# Altium footprint library PcbLib1.PcbLib: 1009 footprints (part 31 of 64)
Each footprint in its own frame and in the unit in brackets; x right, y up, seen from the top. Pads: shape width x height; smd on the part's side, far side on the other; paste and mask are expansions set on the pad; w line width, h text height; cw(c..) or ccw(c..) is an arc to the next point about the centre after c.
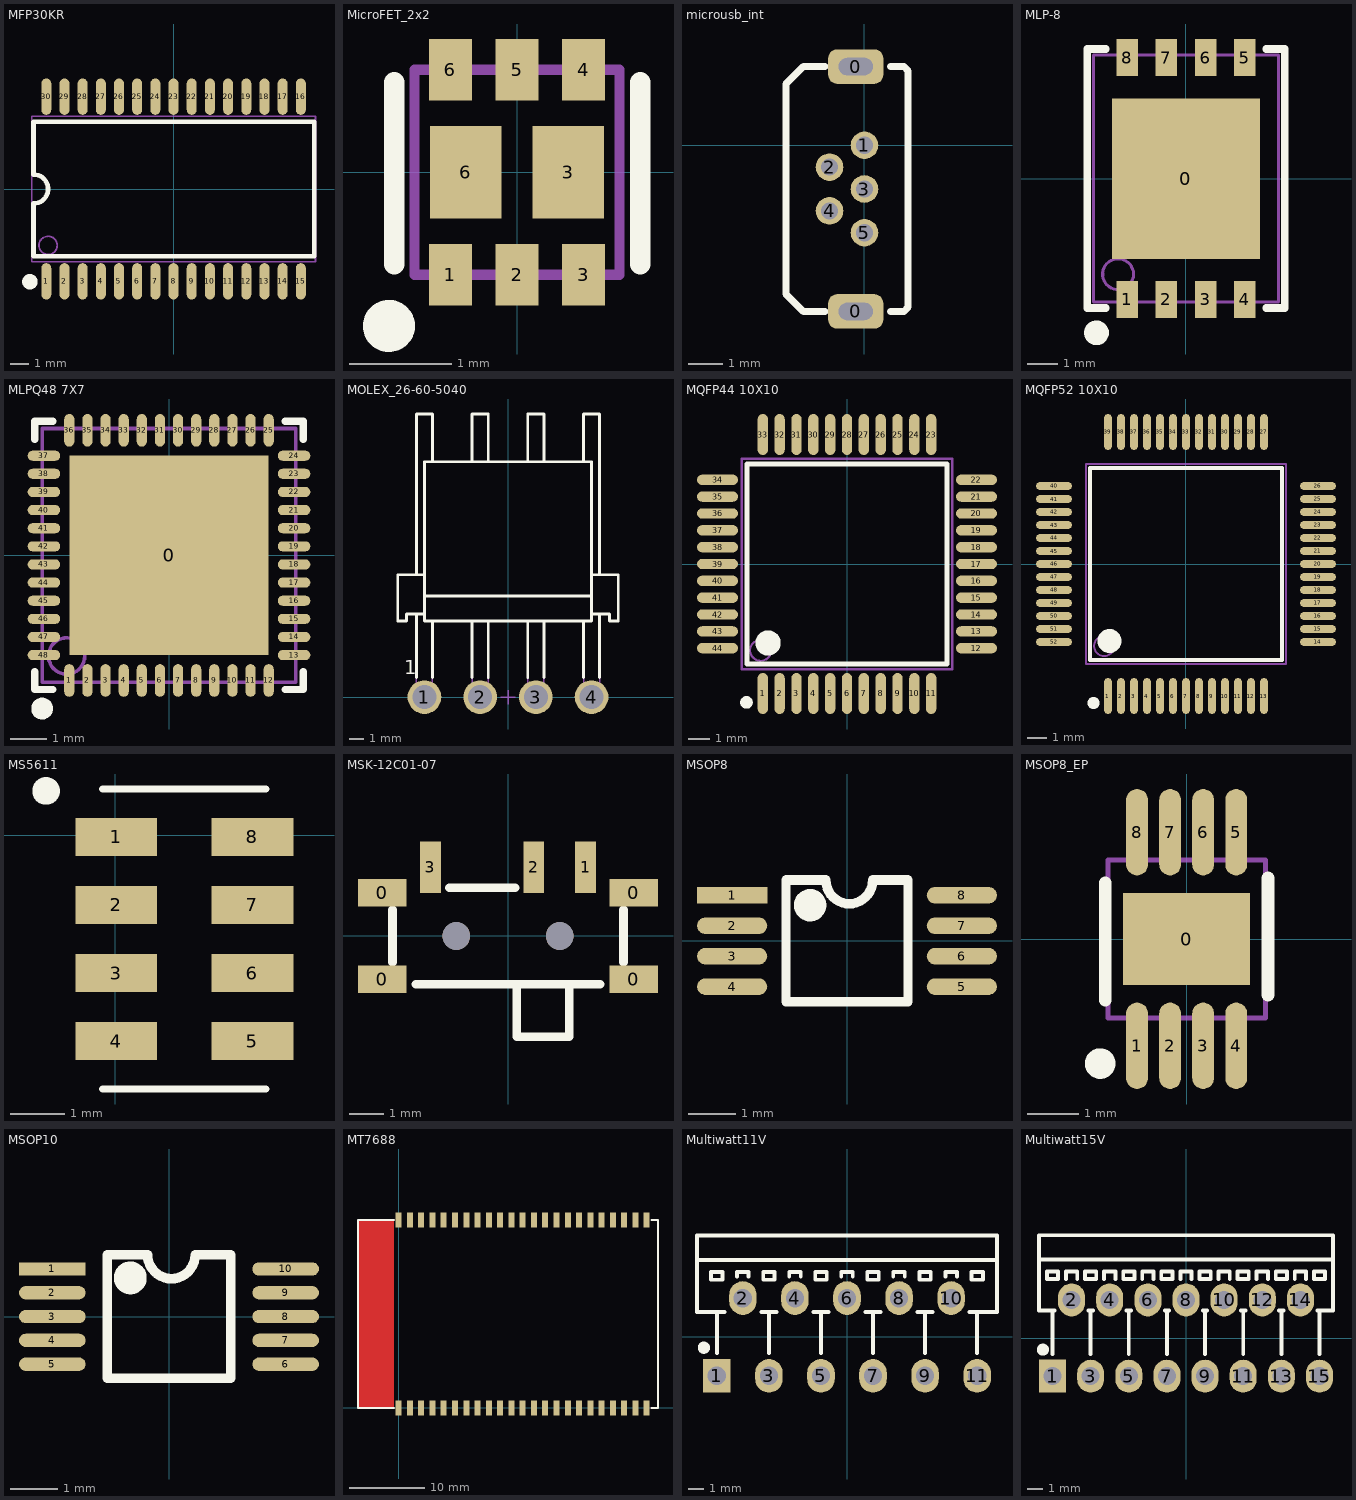
[diagram p30: the footprints below, top view; thin cyan lines are the x and y axes]

## MFP30KR [mm] "THB6128"
pads (30):
  oval 0.55x2 smd: 1(-7,-5.08) 2(-6,-5.08) 3(-5,-5.08) 4(-4,-5.08) 5(-3,-5.08) 6(-2,-5.08) 7(-1,-5.08) 8(0,-5.08) 9(1,-5.08) 10(2,-5.08) 11(3,-5.08) 12(4,-5.08) 13(5,-5.08) 14(6,-5.08) 15(7,-5.08) 16(7,5.08) 17(6,5.08) 18(5,5.08) 19(4,5.08) 20(3,5.08) 21(2,5.08) 22(1,5.08) 23(0,5.08) 24(-1,5.08) 25(-2,5.08) 26(-3,5.08) 27(-4,5.08) 28(-5,5.08) 29(-6,5.08) 30(-7,5.08)
Top Overlay:
  circle w0.45: c-7.9,-5.1 r0.2
  lines w0.254: -7.7,-3.7 -7.7,-0.8 ccw(c-7.7,0) -7.7,0.8 -7.7,3.7 7.732,3.7 7.732,-3.7 -7.7,-3.7
Mechanical 13:
  circle w0.1: c-6.9,-3.1 r0.5
  lines w0.1: -7.8,-4 7.8,-4 7.8,4 -7.8,4 -7.8,-4

## MicroFET_2x2 [mm]
pads (8):
  rect 0.42x0.6 smd mask+0.051: 1(-0.65,-1) 2(0,-1) 3(0.65,-1) 4(0.65,1) 5(0,1) 6(-0.65,1)
  rect 0.7x0.9 smd mask+0.051: 3(0.5,0) 6(-0.5,0)
Top Overlay:
  circle w0.254: c-1.25,-1.5 r0.127
  lines w0.2: -1.2,-0.9 -1.2,0.878 ; 1.2,-0.9 1.2,0.878
Mechanical 13:
  lines w0.1: -1,-1 1,-1 1,1 -1,1 -1,-1

## microusb_int [mm]
pads (7):
  rrect50% 1.6x1 hole 0.5 slot 1 at 0.35 deg mask+0.051: 0(-0.254,-4.826) 0(-0.254,2.286)
  round 0.8 hole 0.5 mask+0.051: 1(0,0) 2(-1.016,-0.635) 3(0,-1.27) 4(-1.016,-1.905) 5(0,-2.54)
Top Overlay:
  lines w0.203: -1.143,-4.826 -1.778,-4.826 -2.286,-4.318 -2.286,1.778 -1.778,2.286 -1.143,2.286 ; 0.762,-4.826 1.143,-4.826 1.27,-4.699 1.27,2.159 1.143,2.286 0.762,2.286

## MLP-8 [mm]
pads (9):
  rect 4.8x5.2 smd: 0(0,0)
  rect 0.7x1.2 smd: 1(-1.905,-3.92) 2(-0.635,-3.92) 3(0.635,-3.92) 4(1.905,-3.92) 5(1.905,3.92) 6(0.635,3.92) 7(-0.635,3.92) 8(-1.905,3.92)
Top Overlay:
  circle w0.4: c-2.9,-5 r0.2
  lines w0.254: -2.6,-4.2 -3.2,-4.2 -3.2,4.2 -2.6,4.2 ; 2.6,-4.2 3.2,-4.2 3.2,4.2 2.6,4.2
Mechanical 13:
  circle w0.1: c-2.2,-3.1 r0.5
  lines w0.1: -3,-4 3,-4 3,4 -3,4 -3,-4

## MLPQ48 7X7 [mm]
pads (49):
  rect 5.5x5.5 smd mask+0.051: 0(0,0)
  oval 0.28x0.9 smd mask+0.051: 1(-2.75,-3.45) 2(-2.25,-3.45) 3(-1.75,-3.45) 4(-1.25,-3.45) 5(-0.75,-3.45) 6(-0.25,-3.45) 7(0.25,-3.45) 8(0.75,-3.45) 9(1.25,-3.45) 10(1.75,-3.45) 11(2.25,-3.45) 12(2.75,-3.45) 25(2.75,3.45) 26(2.25,3.45) 27(1.75,3.45) 28(1.25,3.45) 29(0.75,3.45) 30(0.25,3.45) 31(-0.25,3.45) 32(-0.75,3.45) 33(-1.25,3.45) 34(-1.75,3.45) 35(-2.25,3.45) 36(-2.75,3.45)
  oval 0.9x0.28 smd mask+0.051: 13(3.45,-2.75) 14(3.45,-2.25) 15(3.45,-1.75) 16(3.45,-1.25) 17(3.45,-0.75) 18(3.45,-0.25) 19(3.45,0.25) 20(3.45,0.75) 21(3.45,1.25) 22(3.45,1.75) 23(3.45,2.25) 24(3.45,2.75) 37(-3.45,2.75) 38(-3.45,2.25) 39(-3.45,1.75) 40(-3.45,1.25) 41(-3.45,0.75) 42(-3.45,0.25) 43(-3.45,-0.25) 44(-3.45,-0.75) 45(-3.45,-1.25) 46(-3.45,-1.75) 47(-3.45,-2.25) 48(-3.45,-2.75)
Top Overlay:
  circle w0.3: c-3.5,-4.225 r0.15
  lines w0.2: -3.7,-3.2 -3.7,-3.7 -3.2,-3.7 ; -3.7,3.2 -3.7,3.7 -3.2,3.7 ; 3.2,-3.7 3.7,-3.7 3.7,-3.2 ; 3.2,3.7 3.7,3.7 3.7,3.2
Mechanical 13:
  circle w0.1: c-2.825,-2.775 r0.5
  lines w0.1: -3.5,-3.5 -3.5,3.5 3.5,3.5 3.5,-3.5 -3.5,-3.5

## MOLEX_26-60-5040 [mm] "3.96mm (.156\") Pitch KK?Solid Header,Right Angle, 4 Circuits, Tin (Sn) Plating"
height 9
pads (4):
  round 2.4 hole 1.7: 1(-5.944,0) 2(-1.981,0) 3(1.981,0) 4(5.944,0)
Top Overlay:
  lines w0.2: -6.515,1.387 -6.515,5.918 ; -6.515,8.712 -6.515,20.142 -5.372,20.142 -5.372,16.739 ; -5.944,5.918 -7.214,5.918 -7.214,5.41 -7.849,5.41 -7.849,8.712 -5.944,8.712 ; -5.944,7.188 5.944,7.188 ; -5.372,1.387 -5.372,5.41 ; -2.553,1.387 -2.553,5.41 ; -2.553,16.739 -2.553,20.142 -1.41,20.142 -1.41,16.739 ; -1.41,1.387 -1.41,5.41 ; 1.41,1.387 1.41,5.41 ; 1.41,16.739 1.41,20.142 2.553,20.142 2.553,16.739 ; 2.553,1.387 2.553,5.41 ; 5.372,1.387 5.372,5.41 ; 5.372,16.739 5.372,20.142 6.515,20.142 6.515,8.712 ; 5.944,5.918 7.214,5.918 7.214,5.41 7.849,5.41 7.849,8.712 5.944,8.712 ; 6.515,1.387 6.515,5.918 ; -5.944,5.41 -5.944,16.739 5.944,16.739 5.944,5.41 -5.944,5.41
  text "1" at -7.388,1.62 h1
Mechanical 8:
  lines w0.1: -6.444,0 -5.944,0 ; -5.944,-0.5 -5.944,0 ; -5.944,0.5 -5.944,0 ; -5.444,0 -5.944,0 ; -2.481,0 -1.981,0 ; -1.981,-0.5 -1.981,0 ; -1.981,0.5 -1.981,0 ; -1.481,0 -1.981,0 ; -0.5,0 0,0 ; 0,-0.5 0,0 ; 0,0.5 0,0 ; 0.5,0 0,0 ; 1.481,0 1.981,0 ; 1.981,-0.5 1.981,0 ; 1.981,0.5 1.981,0 ; 2.481,0 1.981,0 ; 5.444,0 5.944,0 ; 5.944,-0.5 5.944,0 ; 5.944,0.5 5.944,0 ; 6.444,0 5.944,0
Mechanical 14:
  lines w0.1: -6.515,5.918 -6.515,-0.572 ; -6.515,8.712 -6.515,20.142 -5.372,20.142 -5.372,16.739 ; -5.944,5.918 -7.214,5.918 -7.214,5.41 -7.849,5.41 -7.849,8.712 -5.944,8.712 ; -5.944,7.188 5.944,7.188 ; -5.372,5.41 -5.372,-0.572 ; -2.553,5.41 -2.553,-0.572 -1.41,-0.572 -1.41,5.41 ; -2.553,16.739 -2.553,20.142 -1.41,20.142 -1.41,16.739 ; 1.41,5.41 1.41,-0.572 2.553,-0.572 2.553,5.41 ; 1.41,16.739 1.41,20.142 2.553,20.142 2.553,16.739 ; 5.372,5.41 5.372,-0.572 6.515,-0.572 6.515,5.918 ; 5.372,16.739 5.372,20.142 6.515,20.142 6.515,8.712 ; 5.944,5.918 7.214,5.918 7.214,5.41 7.849,5.41 7.849,8.712 5.944,8.712 ; -6.515,-0.572 -5.372,-0.572 ; -6.515,-0.572 -5.372,-0.572 ; -5.944,5.41 -5.944,16.739 5.944,16.739 5.944,5.41 -5.944,5.41
  text "1" at -7.388,1.62 h1
3D body "v240-170.stp": height 0.02, standoff -1.65, extent 4.744,-1.2 7.144,1.2
3D body "v240-170.stp": height 0.02, standoff -1.65, extent 0.781,-1.2 3.181,1.2
3D body "v240-170.stp": height 0.02, standoff -1.65, extent -3.181,-1.2 -0.781,1.2
3D body "v240-170.stp": height 0.02, standoff -1.65, extent -7.144,-1.2 -4.744,1.2
3D body "MOLEX_26-60-5040.stp": height 10.01, standoff -3.96, extent -7.849,-0.571 7.849,20.142

## MQFP44 10X10 [mm]
pads (44):
  oval 0.49x1.95 smd: 1(-4,-6.15) 2(-3.2,-6.15) 3(-2.4,-6.15) 4(-1.6,-6.15) 5(-0.8,-6.15) 6(0,-6.15) 7(0.8,-6.15) 8(1.6,-6.15) 9(2.4,-6.15) 10(3.2,-6.15) 11(4,-6.15) 23(4,6.15) 24(3.2,6.15) 25(2.4,6.15) 26(1.6,6.15) 27(0.8,6.15) 28(0,6.15) 29(-0.8,6.15) 30(-1.6,6.15) 31(-2.4,6.15) 32(-3.2,6.15) 33(-4,6.15)
  oval 1.95x0.49 smd: 12(6.15,-4) 13(6.15,-3.2) 14(6.15,-2.4) 15(6.15,-1.6) 16(6.15,-0.8) 17(6.15,0) 18(6.15,0.8) 19(6.15,1.6) 20(6.15,2.4) 21(6.15,3.2) 22(6.15,4) 34(-6.15,4) 35(-6.15,3.2) 36(-6.15,2.4) 37(-6.15,1.6) 38(-6.15,0.8) 39(-6.15,0) 40(-6.15,-0.8) 41(-6.15,-1.6) 42(-6.15,-2.4) 43(-6.15,-3.2) 44(-6.15,-4)
Top Overlay:
  circle w0.6: c-3.75,-3.75 r0.3
  circle w0.3: c-4.775,-6.575 r0.15
  lines w0.254: -4.75,-4.75 -4.75,4.75 4.75,4.75 4.75,-4.75 -4.75,-4.75
Mechanical 13:
  circle w0.1: c-4.1,-4.1 r0.5
  lines w0.1: -5,-5 -5,5 5,5 5,-5 -5,-5

## MQFP52 10X10 [mm]
pads (52):
  oval 0.38x1.8 smd mask+0.051: 1(-3.9,-6.6) 2(-3.25,-6.6) 3(-2.6,-6.6) 4(-1.95,-6.6) 5(-1.3,-6.6) 6(-0.65,-6.6) 7(0,-6.6) 8(0.65,-6.6) 9(1.3,-6.6) 10(1.95,-6.6) 11(2.6,-6.6) 12(3.25,-6.6) 13(3.9,-6.6) 27(3.9,6.6) 28(3.25,6.6) 29(2.6,6.6) 30(1.95,6.6) 31(1.3,6.6) 32(0.65,6.6) 33(0,6.6) 34(-0.65,6.6) 35(-1.3,6.6) 36(-1.95,6.6) 37(-2.6,6.6) 38(-3.25,6.6) 39(-3.9,6.6)
  oval 1.8x0.38 smd mask+0.051: 14(6.6,-3.9) 15(6.6,-3.25) 16(6.6,-2.6) 17(6.6,-1.95) 18(6.6,-1.3) 19(6.6,-0.65) 20(6.6,0) 21(6.6,0.65) 22(6.6,1.3) 23(6.6,1.95) 24(6.6,2.6) 25(6.6,3.25) 26(6.6,3.9) 40(-6.6,3.9) 41(-6.6,3.25) 42(-6.6,2.6) 43(-6.6,1.95) 44(-6.6,1.3) 45(-6.6,0.65) 46(-6.6,0) 47(-6.6,-0.65) 48(-6.6,-1.3) 49(-6.6,-1.95) 50(-6.6,-2.6) 51(-6.6,-3.25) 52(-6.6,-3.9)
Top Overlay:
  circle w0.6: c-3.825,-3.85 r0.3
  circle w0.3: c-4.625,-6.95 r0.15
  lines w0.2: -4.8,-4.8 4.8,-4.8 4.8,4.8 -4.8,4.8 -4.8,-4.8
Mechanical 13:
  circle w0.1: c-4.1,-4.1 r0.5
  lines w0.1: -5,-5 5,-5 5,5 -5,5 -5,-5

## MS5611 [mm]
pads (8):
  rect 1.5x0.7 smd: 1(0.02,-0.03) 2(0.02,-1.28) 3(0.02,-2.53) 4(0.02,-3.78) 5(2.52,-3.78) 6(2.52,-2.53) 7(2.52,-1.28) 8(2.52,-0.03)
Top Overlay:
  circle w0.454: c-1.27,0.813 r0.025
  lines w0.127: -0.23,-4.659 2.77,-4.659 ; -0.23,0.849 2.77,0.849
3D body "SM5611-.STEP": height 1, standoff -0.01, extent -0.23,-4.492 2.77,0.508

## MSK-12C01-07 [mm]
pads (9):
  rect 1.4x0.8 smd: 0(-3.65,-1.25) 0(-3.65,1.25) 0(3.65,-1.25) 0(3.65,1.25)
  rect 0.6x1.5 smd: 1(2.25,1.996) 2(0.75,1.996) 3(-2.25,1.996)
  round 0.8 hole 0.8: " "(-1.5,0) " "(1.5,0)
Top Overlay:
  lines w0.254: -3.35,-0.762 -3.35,0.762 ; -2.667,-1.397 2.667,-1.397 ; -1.699,1.397 0.206,1.397 ; 0.254,-1.4 0.254,-2.921 1.778,-2.921 1.778,-1.4 ; 3.35,-0.762 3.35,0.762
3D body "MSK-12C01-07.STEP": height 1.5, standoff -0.5, extent -3.92,-2.887 3.92,2.413

## MSOP8 [mm]
pads (8):
  rect 1.5x0.35 smd: 1(-2.45,0.975)
  oval 1.5x0.35 smd: 2(-2.45,0.325) 3(-2.45,-0.325) 4(-2.45,-0.975) 5(2.45,-0.975) 6(2.45,-0.325) 7(2.45,0.325) 8(2.45,0.975)
Top Overlay:
  circle w0.381: c-0.787,0.762 r0.155
  lines w0.2: -1.3,1.3 -1.3,-1.3 1.3,-1.3 1.3,1.3
  lines w0.203: -1.3,1.3 -0.46,1.3 ; -0.45,1.3 ccw(c0.058,1.3) 0.058,0.792 ; 0.042,0.792 ccw(c0.042,1.3) 0.55,1.3 ; 0.556,1.3 1.3,1.3
3D body "MSOP8.STEP": height 0.95, standoff 0, extent -2.45,-1.499 2.45,1.501

## MSOP8_EP [mm] "MSOP-8, with EP"
pads (9):
  rect 2.5x1.8 smd mask+0.051: 0(0,0)
  oval 0.43x1.7 smd mask+0.051: 1(-0.975,-2.1) 2(-0.325,-2.1) 3(0.325,-2.1) 4(0.975,-2.1) 5(0.975,2.1) 6(0.325,2.1) 7(-0.325,2.1) 8(-0.975,2.1)
Top Overlay:
  circle w0.3: c-1.7,-2.45 r0.15
  lines w0.254: -1.6,-1.2 -1.6,1.1 ; 1.6,-1.1 1.6,1.2
Mechanical 13:
  lines w0.1: -1.55,-1.55 1.55,-1.55 1.55,1.55 -1.55,1.55 -1.55,-1.55
3D body "SW3dPS-MSOP8.STEP": height 1.05, standoff -0.05, extent -1.551,-2.469 1.549,2.469

## MSOP10 [mm]
pads (10):
  rect 1.4x0.28 smd: 1(-2.45,1)
  oval 1.4x0.28 smd: 2(-2.45,0.5) 3(-2.45,0) 4(-2.45,-0.5) 5(-2.45,-1) 6(2.45,-1) 7(2.45,-0.5) 8(2.45,0) 9(2.45,0.5) 10(2.45,1)
Top Overlay:
  circle w0.381: c-0.813,0.813 r0.155
  lines w0.2: -1.3,1.3 -1.3,-1.3 1.3,-1.3 1.3,1.3
  lines w0.203: -1.3,1.3 -0.46,1.3 ; -0.45,1.3 ccw(c0.058,1.3) 0.058,0.792 ; 0.042,0.792 ccw(c0.042,1.3) 0.55,1.3 ; 0.556,1.3 1.3,1.3
3D body "MSOP10.STEP": height 0.95, standoff 0, extent -2.425,-1.524 2.475,1.476

## MT7688 [mm] "WiFi模块"
pads (46):
  rect 0.8x2 smd: 1(0,0) 2(1.5,0) 3(3,0) 4(4.5,0) 5(6,0) 6(7.5,0) 7(9,0) 8(10.5,0) 9(12,0) 10(13.5,0) 11(15,0) 12(16.5,0) 13(18,0) 14(19.5,0) 15(21,0) 16(22.5,0) 17(24,0) 18(25.5,0) 19(27,0) 20(28.5,0) 21(30,0) 22(31.5,0) 23(33,0) 24(33,25) 25(31.5,25) 26(30,25) 27(28.5,25) 28(27,25) 29(25.5,25) 30(24,25) 31(22.5,25) 32(21,25) 33(19.5,25) 34(18,25) 35(16.5,25) 36(15,25) 37(13.5,25) 38(12,25) 39(10.5,25) 40(9,25) 41(7.5,25) 42(6,25) 43(4.5,25) 44(3,25) 45(1.5,25) 46(0,25)
Top Layer:
  pour cut-out: -5.4,25.019 -0.635,25.019 -0.635,0 -5.4,0
Bottom Layer:
  pour cut-out: -5.4,25.019 -0.635,25.019 -0.635,0 -5.4,0
Top Overlay:
  lines w0.254: -0.635,0 -5.4,0 -5.4,25.019 -0.635,25.019 ; 33.63,25.019 34.5,25.019 34.5,0 33.655,0

## Multiwatt11V [mm]
pads (11):
  rect 1.8x2.2 hole 1.2: 1(-8.5,-2.54)
  oval 1.8x2.2 hole 1.2: 2(-6.8,2.54) 3(-5.1,-2.54) 4(-3.4,2.54) 5(-1.7,-2.54) 6(0,2.54) 7(1.7,-2.54) 8(3.4,2.54) 9(5.1,-2.54) 10(6.8,2.54) 11(8.5,-2.54)
Top Overlay:
  circle w0.4: c-9.35,-0.7 r0.2
  lines w0.254: -8.5,-1.06 -8.5,1.64 ; -8,1.64 -9.8,1.64 -9.8,5.04 ; -7.175,3.94 -7.175,4.24 -6.425,4.24 -6.425,3.94 ; -5.6,1.64 -4.6,1.64 ; -5.1,-1.06 -5.1,1.64 ; -3.775,3.94 -3.775,4.24 -3.025,4.24 -3.025,3.94 ; -2.2,1.64 -1.2,1.64 ; -1.7,-1.06 -1.7,1.64 ; -0.375,3.94 -0.375,4.24 0.375,4.24 0.375,3.94 ; 1.2,1.64 2.2,1.64 ; 1.7,-1.06 1.7,1.64 ; 3.025,3.94 3.025,4.24 3.775,4.24 3.775,3.94 ; 4.6,1.64 5.6,1.64 ; 5.1,-1.06 5.1,1.64 ; 6.425,3.94 6.425,4.24 7.175,4.24 7.175,3.94 ; 8,1.64 9.8,1.64 9.8,5.04 ; 8.5,-1.06 8.5,1.64 ; -9.8,5.04 9.8,5.04 ; -9.8,5.04 -9.8,6.64 9.8,6.64 9.8,5.04 ; -8.875,3.74 -8.125,3.74 -8.125,4.24 -8.875,4.24 -8.875,3.74 ; -5.475,3.74 -5.475,4.24 -4.725,4.24 -4.725,3.74 -5.475,3.74 ; -2.075,3.74 -2.075,4.24 -1.325,4.24 -1.325,3.74 -2.075,3.74 ; 1.325,3.74 1.325,4.24 2.075,4.24 2.075,3.74 1.325,3.74 ; 4.725,3.74 4.725,4.24 5.475,4.24 5.475,3.74 4.725,3.74 ; 8.125,3.74 8.875,3.74 8.875,4.24 8.125,4.24 8.125,3.74

## Multiwatt15V [mm]
pads (15):
  rect 1.8x2.2 hole 1.2: 1(-8.89,-2.54)
  oval 1.8x2.2 hole 1.2: 2(-7.62,2.54) 3(-6.35,-2.54) 4(-5.08,2.54) 5(-3.81,-2.54) 6(-2.54,2.54) 7(-1.27,-2.54) 8(0,2.54) 9(1.27,-2.54) 10(2.54,2.54) 11(3.81,-2.54) 12(5.08,2.54) 13(6.35,-2.54) 14(7.62,2.54) 15(8.89,-2.54)
Top Overlay:
  circle w0.4: c-9.525,-0.775 r0.2
  lines w0.254: -8.89,-1.06 -8.89,1.84 ; -8.74,1.84 -9.8,1.84 -9.8,5.24 ; -7.995,3.94 -7.995,4.44 -7.245,4.44 -7.245,3.94 ; -6.5,1.84 -6.2,1.84 ; -6.35,-1.06 -6.35,1.84 ; -5.455,3.94 -5.455,4.44 -4.705,4.44 -4.705,3.94 ; -3.96,1.84 -3.66,1.84 ; -3.81,-1.06 -3.81,1.84 ; -2.915,3.94 -2.915,4.44 -2.165,4.44 -2.165,3.94 ; -1.42,1.84 -1.12,1.84 ; -1.27,-1.06 -1.27,1.84 ; -0.375,3.94 -0.375,4.44 0.375,4.44 0.375,3.94 ; 1.12,1.84 1.42,1.84 ; 1.27,-1.06 1.27,1.84 ; 2.165,3.94 2.165,4.44 2.915,4.44 2.915,3.94 ; 3.66,1.84 3.96,1.84 ; 3.81,-1.06 3.81,1.84 ; 4.705,3.94 4.705,4.44 5.455,4.44 5.455,3.94 ; 6.2,1.84 6.5,1.84 ; 6.35,-1.06 6.35,1.84 ; 7.245,3.94 7.245,4.44 7.995,4.44 7.995,3.94 ; 8.74,1.84 9.8,1.84 9.8,5.24 ; 8.89,-1.06 8.89,1.84 ; -9.8,5.24 -9.8,6.84 9.8,6.84 9.8,5.24 ; -9.8,5.24 9.8,5.24 ; -9.265,3.94 -9.265,4.44 -8.515,4.44 -8.515,3.94 -9.265,3.94 ; -6.725,3.94 -6.725,4.44 -5.975,4.44 -5.975,3.94 -6.725,3.94 ; -4.185,3.94 -4.185,4.44 -3.435,4.44 -3.435,3.94 -4.185,3.94 ; -1.645,3.94 -0.895,3.94 -0.895,4.44 -1.645,4.44 -1.645,3.94 ; 0.895,3.94 0.895,4.44 1.645,4.44 1.645,3.94 0.895,3.94 ; 3.435,3.94 3.435,4.44 4.185,4.44 4.185,3.94 3.435,3.94 ; 5.975,3.94 5.975,4.44 6.725,4.44 6.725,3.94 5.975,3.94 ; 8.515,3.94 9.265,3.94 9.265,4.44 8.515,4.44 8.515,3.94